# Altium footprint library Wedka_PcbLib.PcbLib: 18 footprints (part 2 of 2)
Each footprint in its own frame and in the unit in brackets; x right, y up, seen from the top. Pads: shape width x height; smd on the part's side, far side on the other; paste and mask are expansions set on the pad; w line width, h text height; cw(c..) or ccw(c..) is an arc to the next point about the centre after c.
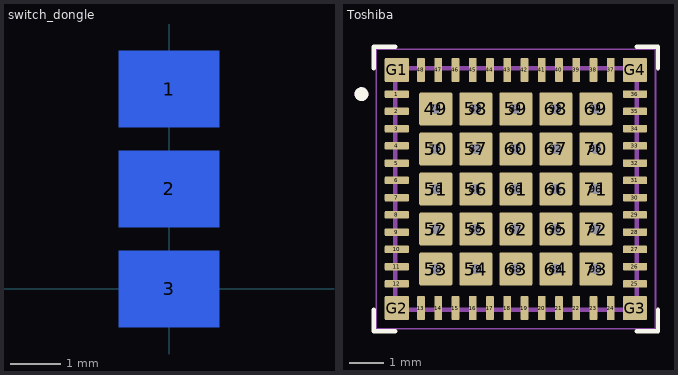
[diagram p1: the footprints below, top view; thin cyan lines are the x and y axes]

## switch_dongle [mm]
pads (3):
  rect 2x1.524 smd far side: 1(-0.001,3.994) 2(-0.001,1.994) 3(-0.001,-0.006)

## Toshiba [mm]
pads (102):
  rrect25% 0.7x0.22 smd: 1(56.743,-6.88) 2(56.743,-7.38) 3(56.743,-7.88) 4(56.743,-8.38) 5(56.743,-8.88) 6(56.743,-9.38) 7(56.743,-9.88) 8(56.743,-10.38) 9(56.743,-10.88) 10(56.743,-11.38) 11(56.743,-11.88) 12(56.743,-12.38) 25(63.643,-12.38) 26(63.643,-11.88) 27(63.643,-11.38) 28(63.643,-10.88) 29(63.643,-10.38) 30(63.643,-9.88) 31(63.643,-9.38) 32(63.643,-8.88) 33(63.643,-8.38) 34(63.643,-7.88) 35(63.643,-7.38) 36(63.643,-6.88)
  rrect25% 0.22x0.7 smd: 13(57.443,-13.08) 14(57.943,-13.08) 15(58.443,-13.08) 16(58.943,-13.08) 17(59.443,-13.08) 18(59.943,-13.08) 19(60.443,-13.08) 20(60.943,-13.08) 21(61.443,-13.08) 22(61.943,-13.08) 23(62.443,-13.08) 24(62.943,-13.08) 37(62.943,-6.18) 38(62.443,-6.18) 39(61.943,-6.18) 40(61.443,-6.18) 41(60.943,-6.18) 42(60.443,-6.18) 43(59.943,-6.18) 44(59.443,-6.18) 45(58.943,-6.18) 46(58.443,-6.18) 47(57.943,-6.18) 48(57.443,-6.18)
  rrect10% 0.96x0.96 smd: 49(57.873,-7.31) 50(57.873,-8.47) 51(57.873,-9.63) 52(57.873,-10.79) 53(57.873,-11.95) 54(59.033,-11.95) 55(59.033,-10.79) 56(59.033,-9.63) 57(59.033,-8.47) 58(59.033,-7.31) 59(60.193,-7.31) 60(60.193,-8.47) 61(60.193,-9.63) 62(60.193,-10.79) 63(60.193,-11.95) 64(61.353,-11.95) 65(61.353,-10.79) 66(61.353,-9.63) 67(61.353,-8.47) 68(61.353,-7.31) 69(62.513,-7.31) 70(62.513,-8.47) 71(62.513,-9.63) 72(62.513,-10.79) 73(62.513,-11.95)
  round 0.5 hole 0.3: 74(57.873,-7.31) 75(57.873,-8.47) 76(57.873,-9.63) 77(57.873,-10.79) 78(57.873,-11.95) 79(59.033,-11.95) 80(59.033,-10.79) 81(59.033,-9.63) 82(59.033,-8.47) 83(59.033,-7.31) 84(60.193,-7.31) 85(60.193,-8.47) 86(60.193,-9.63) 87(60.193,-10.79) 88(60.193,-11.95) 89(61.353,-11.95) 90(61.353,-10.79) 91(61.353,-9.63) 92(61.353,-8.47) 93(61.353,-7.31) 94(62.513,-7.31) 95(62.513,-8.47) 96(62.513,-9.63) 97(62.513,-10.79) 98(62.513,-11.95)
  rrect10% 0.7x0.7 smd: G1(56.743,-6.18) G2(56.743,-13.08) G3(63.643,-13.08) G4(63.643,-6.18)
Top Overlay:
  circle w0.2: c55.718,-6.88 r0.1
  lines w0.127: 56.073,-13.13 56.073,-13.75 56.693,-13.75 ; 56.073,-6.13 56.073,-5.51 56.693,-5.51 ; 63.693,-13.75 64.313,-13.75 64.313,-13.13 ; 63.693,-5.51 64.313,-5.51 64.313,-6.13
Mechanical 13:
  circle w0.2: c55.718,-6.88 r0.1
  lines w0.127: 56.693,-13.13 63.693,-13.13 63.693,-6.13 56.693,-6.13 56.693,-13.13
Mechanical 15:
  lines w0.05: 56.143,-13.68 64.243,-13.68 64.243,-5.58 56.143,-5.58 56.143,-13.68
3D body "TB67S249FTG P-VQFN48-0707-0.50-004.SLDPRT": height 1.01, standoff 0.01, extent 56.643,-13.18 63.743,-6.08